# Altium schematic symbol library jlcpcb_2025_04_capacitors_extended_0603.schlib: 3668 symbols (part 9 of 20) (continued)
## CC0603GRNPO9BN201
designator C?  Capacitance: 200pF  (hidden comment: *)
Capacitor, Ceramic (MLCC), 200pF, ±2%, 50V, NP0, ±2%, SMD 0603; Manufacturer: YAGEO; Manufacturer Part Number: CC0603GRNPO9BN201; Package Size: 0603; JLCPCB Basic Part: No; JLCPCB Part Number: C519477; Supplier 1: LCSC; Category: Capacitors - MLCC; Supplier Part Number 1: C519477; Tolerance: ±2%; Voltage Rating: 50V; Temperature Coefficient: NP0; RoHS: Yes; ComponentLink1Description: Datasheet; ComponentLink1URL: https://wmsc.lcsc.com/wmsc/upload/file/pdf/v2/lcsc/2006011835_YAGEO-CC0603GRNPO9BN201_C519477.pdf; ComponentLink2Description: JLCPCB Part URL; ComponentLink2URL: https://jlcpcb.com/partdetail/C519477; ComponentLink3Description: LCSC Part URL; ComponentLink3URL: https://lcsc.com/product-detail/Multilayer-Ceramic-Capacitors-MLCC---SMD-SMT_YAGEO-YAGEO-CC0603GRNPO9BN201_C519477.html
footprint CAP-0603 (0603 (1608M) Capacitor)
pins: 1, 2

## CC0603GRNPO9BN220
designator C?  Capacitance: 22pF  (hidden comment: *)
Capacitor, Ceramic (MLCC), 22pF, ±2%, 50V, NP0, ±2%, SMD 0603; Manufacturer: YAGEO; Manufacturer Part Number: CC0603GRNPO9BN220; Package Size: 0603; JLCPCB Basic Part: No; JLCPCB Part Number: C327276; Supplier 1: LCSC; Category: Capacitors - MLCC; Supplier Part Number 1: C327276; Tolerance: ±2%; Voltage Rating: 50V; Temperature Coefficient: NP0; RoHS: Yes; ComponentLink1Description: Datasheet; ComponentLink1URL: https://wmsc.lcsc.com/wmsc/upload/file/pdf/v2/lcsc/1811141233_YAGEO-CC0603GRNPO9BN220_C327276.pdf; ComponentLink2Description: JLCPCB Part URL; ComponentLink2URL: https://jlcpcb.com/partdetail/C327276; ComponentLink3Description: LCSC Part URL; ComponentLink3URL: https://lcsc.com/product-detail/Multilayer-Ceramic-Capacitors-MLCC---SMD-SMT_YAGEO-YAGEO-CC0603GRNPO9BN220_C327276.html
footprint CAP-0603 (0603 (1608M) Capacitor)
pins: 1, 2

## CC0603GRNPO9BN221
designator C?  Capacitance: 220pF  (hidden comment: *)
Capacitor, Ceramic (MLCC), 220pF, ±2%, 50V, NP0, ±2%, SMD 0603; Manufacturer: YAGEO; Manufacturer Part Number: CC0603GRNPO9BN221; Package Size: 0603; JLCPCB Basic Part: No; JLCPCB Part Number: C327167; Supplier 1: LCSC; Category: Capacitors - MLCC; Supplier Part Number 1: C327167; Tolerance: ±2%; Voltage Rating: 50V; Temperature Coefficient: NP0; RoHS: Yes; ComponentLink1Description: Datasheet; ComponentLink1URL: https://wmsc.lcsc.com/wmsc/upload/file/pdf/v2/lcsc/1811111710_YAGEO-CC0603GRNPO9BN221_C327167.pdf; ComponentLink2Description: JLCPCB Part URL; ComponentLink2URL: https://jlcpcb.com/partdetail/C327167; ComponentLink3Description: LCSC Part URL; ComponentLink3URL: https://lcsc.com/product-detail/Multilayer-Ceramic-Capacitors-MLCC---SMD-SMT_YAGEO-YAGEO-CC0603GRNPO9BN221_C327167.html
footprint CAP-0603 (0603 (1608M) Capacitor)
pins: 1, 2

## CC0603GRNPO9BN222
designator C?  Capacitance: 2.2nF  (hidden comment: *)
Capacitor, Ceramic (MLCC), 2.2nF, ±2%, 50V, NP0, ±2%, SMD 0603; Manufacturer: YAGEO; Manufacturer Part Number: CC0603GRNPO9BN222; Package Size: 0603; JLCPCB Basic Part: No; JLCPCB Part Number: C576798; Supplier 1: LCSC; Category: Capacitors - MLCC; Supplier Part Number 1: C576798; Tolerance: ±2%; Voltage Rating: 50V; Temperature Coefficient: NP0; RoHS: Yes; ComponentLink1Description: Datasheet; ComponentLink1URL: https://wmsc.lcsc.com/wmsc/upload/file/pdf/v2/lcsc/2204291600_YAGEO-CC0603GRNPO9BN222_C576798.pdf; ComponentLink2Description: JLCPCB Part URL; ComponentLink2URL: https://jlcpcb.com/partdetail/C576798; ComponentLink3Description: LCSC Part URL; ComponentLink3URL: https://lcsc.com/product-detail/Multilayer-Ceramic-Capacitors-MLCC---SMD-SMT_YAGEO-YAGEO-CC0603GRNPO9BN222_C576798.html
footprint CAP-0603 (0603 (1608M) Capacitor)
pins: 1, 2

## CC0603GRNPO9BN240
designator C?  Capacitance: 24pF  (hidden comment: *)
Capacitor, Ceramic (MLCC), 24pF, ±2%, 50V, NP0, ±2%, SMD 0603; Manufacturer: YAGEO; Manufacturer Part Number: CC0603GRNPO9BN240; Package Size: 0603; JLCPCB Basic Part: No; JLCPCB Part Number: C519461; Supplier 1: LCSC; Category: Capacitors - MLCC; Supplier Part Number 1: C519461; Tolerance: ±2%; Voltage Rating: 50V; Temperature Coefficient: NP0; RoHS: Yes; ComponentLink1Description: Datasheet; ComponentLink1URL: https://wmsc.lcsc.com/wmsc/upload/file/pdf/v2/lcsc/2005141203_YAGEO-CC0603GRNPO9BN240_C519461.pdf; ComponentLink2Description: JLCPCB Part URL; ComponentLink2URL: https://jlcpcb.com/partdetail/C519461; ComponentLink3Description: LCSC Part URL; ComponentLink3URL: https://lcsc.com/product-detail/Multilayer-Ceramic-Capacitors-MLCC---SMD-SMT_YAGEO-YAGEO-CC0603GRNPO9BN240_C519461.html
footprint CAP-0603 (0603 (1608M) Capacitor)
pins: 1, 2

## CC0603GRNPO9BN270
designator C?  Capacitance: 27pF  (hidden comment: *)
Capacitor, Ceramic (MLCC), 27pF, ±2%, 50V, NP0, ±2%, SMD 0603; Manufacturer: YAGEO; Manufacturer Part Number: CC0603GRNPO9BN270; Package Size: 0603; JLCPCB Basic Part: No; JLCPCB Part Number: C519453; Supplier 1: LCSC; Category: Capacitors - MLCC; Supplier Part Number 1: C519453; Tolerance: ±2%; Voltage Rating: 50V; Temperature Coefficient: NP0; RoHS: Yes; ComponentLink1Description: Datasheet; ComponentLink1URL: https://wmsc.lcsc.com/wmsc/upload/file/pdf/v2/lcsc/2007161234_YAGEO-CC0603GRNPO9BN270_C519453.pdf; ComponentLink2Description: JLCPCB Part URL; ComponentLink2URL: https://jlcpcb.com/partdetail/C519453; ComponentLink3Description: LCSC Part URL; ComponentLink3URL: https://lcsc.com/product-detail/Multilayer-Ceramic-Capacitors-MLCC---SMD-SMT_YAGEO-YAGEO-CC0603GRNPO9BN270_C519453.html
footprint CAP-0603 (0603 (1608M) Capacitor)
pins: 1, 2

## CC0603GRNPO9BN271
designator C?  Capacitance: 270pF  (hidden comment: *)
Capacitor, Ceramic (MLCC), 270pF, ±2%, 50V, NP0, ±2%, SMD 0603; Manufacturer: YAGEO; Manufacturer Part Number: CC0603GRNPO9BN271; Package Size: 0603; JLCPCB Basic Part: No; JLCPCB Part Number: C327196; Supplier 1: LCSC; Category: Capacitors - MLCC; Supplier Part Number 1: C327196; Tolerance: ±2%; Voltage Rating: 50V; Temperature Coefficient: NP0; RoHS: Yes; ComponentLink1Description: Datasheet; ComponentLink1URL: https://wmsc.lcsc.com/wmsc/upload/file/pdf/v2/lcsc/1811141233_YAGEO-CC0603GRNPO9BN271_C327196.pdf; ComponentLink2Description: JLCPCB Part URL; ComponentLink2URL: https://jlcpcb.com/partdetail/C327196; ComponentLink3Description: LCSC Part URL; ComponentLink3URL: https://lcsc.com/product-detail/Multilayer-Ceramic-Capacitors-MLCC---SMD-SMT_YAGEO-YAGEO-CC0603GRNPO9BN271_C327196.html
footprint CAP-0603 (0603 (1608M) Capacitor)
pins: 1, 2

## CC0603GRNPO9BN300
designator C?  Capacitance: 30pF  (hidden comment: *)
Capacitor, Ceramic (MLCC), 30pF, ±2%, 50V, NP0, ±2%, SMD 0603; Manufacturer: YAGEO; Manufacturer Part Number: CC0603GRNPO9BN300; Package Size: 0603; JLCPCB Basic Part: No; JLCPCB Part Number: C327012; Supplier 1: LCSC; Category: Capacitors - MLCC; Supplier Part Number 1: C327012; Tolerance: ±2%; Voltage Rating: 50V; Temperature Coefficient: NP0; RoHS: Yes; ComponentLink1Description: Datasheet; ComponentLink1URL: https://wmsc.lcsc.com/wmsc/upload/file/pdf/v2/lcsc/1811141226_YAGEO-CC0603GRNPO9BN300_C327012.pdf; ComponentLink2Description: JLCPCB Part URL; ComponentLink2URL: https://jlcpcb.com/partdetail/C327012; ComponentLink3Description: LCSC Part URL; ComponentLink3URL: https://lcsc.com/product-detail/Multilayer-Ceramic-Capacitors-MLCC---SMD-SMT_YAGEO-YAGEO-CC0603GRNPO9BN300_C327012.html
footprint CAP-0603 (0603 (1608M) Capacitor)
pins: 1, 2

## CC0603GRNPO9BN301
designator C?  Capacitance: 300pF  (hidden comment: *)
Capacitor, Ceramic (MLCC), 300pF, ±2%, 50V, NP0, ±2%, SMD 0603; Manufacturer: YAGEO; Manufacturer Part Number: CC0603GRNPO9BN301; Package Size: 0603; JLCPCB Basic Part: No; JLCPCB Part Number: C519478; Supplier 1: LCSC; Category: Capacitors - MLCC; Supplier Part Number 1: C519478; Tolerance: ±2%; Voltage Rating: 50V; Temperature Coefficient: NP0; RoHS: Yes; ComponentLink1Description: Datasheet; ComponentLink1URL: https://wmsc.lcsc.com/wmsc/upload/file/pdf/v2/lcsc/2008122133_YAGEO-CC0603GRNPO9BN301_C519478.pdf; ComponentLink2Description: JLCPCB Part URL; ComponentLink2URL: https://jlcpcb.com/partdetail/C519478; ComponentLink3Description: LCSC Part URL; ComponentLink3URL: https://lcsc.com/product-detail/Multilayer-Ceramic-Capacitors-MLCC---SMD-SMT_YAGEO-YAGEO-CC0603GRNPO9BN301_C519478.html
footprint CAP-0603 (0603 (1608M) Capacitor)
pins: 1, 2

## CC0603GRNPO9BN330
designator C?  Capacitance: 33pF  (hidden comment: *)
Capacitor, Ceramic (MLCC), 33pF, ±2%, 50V, NP0, ±2%, SMD 0603; Manufacturer: YAGEO; Manufacturer Part Number: CC0603GRNPO9BN330; Package Size: 0603; JLCPCB Basic Part: No; JLCPCB Part Number: C519454; Supplier 1: LCSC; Category: Capacitors - MLCC; Supplier Part Number 1: C519454; Tolerance: ±2%; Voltage Rating: 50V; Temperature Coefficient: NP0; RoHS: Yes; ComponentLink1Description: Datasheet; ComponentLink1URL: https://wmsc.lcsc.com/wmsc/upload/file/pdf/v2/lcsc/2006011834_YAGEO-CC0603GRNPO9BN330_C519454.pdf; ComponentLink2Description: JLCPCB Part URL; ComponentLink2URL: https://jlcpcb.com/partdetail/C519454; ComponentLink3Description: LCSC Part URL; ComponentLink3URL: https://lcsc.com/product-detail/Multilayer-Ceramic-Capacitors-MLCC---SMD-SMT_YAGEO-YAGEO-CC0603GRNPO9BN330_C519454.html
footprint CAP-0603 (0603 (1608M) Capacitor)
pins: 1, 2

## CC0603GRNPO9BN331
designator C?  Capacitance: 330pF  (hidden comment: *)
Capacitor, Ceramic (MLCC), 330pF, ±2%, 50V, NP0, ±2%, SMD 0603; Manufacturer: YAGEO; Manufacturer Part Number: CC0603GRNPO9BN331; Package Size: 0603; JLCPCB Basic Part: No; JLCPCB Part Number: C327195; Supplier 1: LCSC; Category: Capacitors - MLCC; Supplier Part Number 1: C327195; Tolerance: ±2%; Voltage Rating: 50V; Temperature Coefficient: NP0; RoHS: Yes; ComponentLink1Description: Datasheet; ComponentLink1URL: https://wmsc.lcsc.com/wmsc/upload/file/pdf/v2/lcsc/1811141233_YAGEO-CC0603GRNPO9BN331_C327195.pdf; ComponentLink2Description: JLCPCB Part URL; ComponentLink2URL: https://jlcpcb.com/partdetail/C327195; ComponentLink3Description: LCSC Part URL; ComponentLink3URL: https://lcsc.com/product-detail/Multilayer-Ceramic-Capacitors-MLCC---SMD-SMT_YAGEO-YAGEO-CC0603GRNPO9BN331_C327195.html
footprint CAP-0603 (0603 (1608M) Capacitor)
pins: 1, 2

## CC0603GRNPO9BN360
designator C?  Capacitance: 36pF  (hidden comment: *)
Capacitor, Ceramic (MLCC), 36pF, ±2%, 50V, NP0, ±2%, SMD 0603; Manufacturer: YAGEO; Manufacturer Part Number: CC0603GRNPO9BN360; Package Size: 0603; JLCPCB Basic Part: No; JLCPCB Part Number: C519462; Supplier 1: LCSC; Category: Capacitors - MLCC; Supplier Part Number 1: C519462; Tolerance: ±2%; Voltage Rating: 50V; Temperature Coefficient: NP0; RoHS: Yes; ComponentLink1Description: Datasheet; ComponentLink1URL: https://wmsc.lcsc.com/wmsc/upload/file/pdf/v2/lcsc/2005141203_YAGEO-CC0603GRNPO9BN360_C519462.pdf; ComponentLink2Description: JLCPCB Part URL; ComponentLink2URL: https://jlcpcb.com/partdetail/C519462; ComponentLink3Description: LCSC Part URL; ComponentLink3URL: https://lcsc.com/product-detail/Multilayer-Ceramic-Capacitors-MLCC---SMD-SMT_YAGEO-YAGEO-CC0603GRNPO9BN360_C519462.html
footprint CAP-0603 (0603 (1608M) Capacitor)
pins: 1, 2

## CC0603GRNPO9BN391
designator C?  Capacitance: 390pF  (hidden comment: *)
Capacitor, Ceramic (MLCC), 390pF, ±2%, 50V, NP0, ±2%, SMD 0603; Manufacturer: YAGEO; Manufacturer Part Number: CC0603GRNPO9BN391; Package Size: 0603; JLCPCB Basic Part: No; JLCPCB Part Number: C519471; Supplier 1: LCSC; Category: Capacitors - MLCC; Supplier Part Number 1: C519471; Tolerance: ±2%; Voltage Rating: 50V; Temperature Coefficient: NP0; RoHS: Yes; ComponentLink1Description: Datasheet; ComponentLink1URL: https://wmsc.lcsc.com/wmsc/upload/file/pdf/v2/lcsc/2005181835_YAGEO-CC0603GRNPO9BN391_C519471.pdf; ComponentLink2Description: JLCPCB Part URL; ComponentLink2URL: https://jlcpcb.com/partdetail/C519471; ComponentLink3Description: LCSC Part URL; ComponentLink3URL: https://lcsc.com/product-detail/Multilayer-Ceramic-Capacitors-MLCC---SMD-SMT_YAGEO-YAGEO-CC0603GRNPO9BN391_C519471.html
footprint CAP-0603 (0603 (1608M) Capacitor)
pins: 1, 2

## CC0603GRNPO9BN430
designator C?  Capacitance: 43pF  (hidden comment: *)
Capacitor, Ceramic (MLCC), 43pF, ±2%, 50V, NP0, ±2%, SMD 0603; Manufacturer: YAGEO; Manufacturer Part Number: CC0603GRNPO9BN430; Package Size: 0603; JLCPCB Basic Part: No; JLCPCB Part Number: C519463; Supplier 1: LCSC; Category: Capacitors - MLCC; Supplier Part Number 1: C519463; Tolerance: ±2%; Voltage Rating: 50V; Temperature Coefficient: NP0; RoHS: Yes; ComponentLink1Description: Datasheet; ComponentLink1URL: https://wmsc.lcsc.com/wmsc/upload/file/pdf/v2/lcsc/2007231533_YAGEO-CC0603GRNPO9BN430_C519463.pdf; ComponentLink2Description: JLCPCB Part URL; ComponentLink2URL: https://jlcpcb.com/partdetail/C519463; ComponentLink3Description: LCSC Part URL; ComponentLink3URL: https://lcsc.com/product-detail/Multilayer-Ceramic-Capacitors-MLCC---SMD-SMT_YAGEO-YAGEO-CC0603GRNPO9BN430_C519463.html
footprint CAP-0603 (0603 (1608M) Capacitor)
pins: 1, 2

## CC0603GRNPO9BN470
designator C?  Capacitance: 47pF  (hidden comment: *)
Capacitor, Ceramic (MLCC), 47pF, ±2%, 50V, NP0, ±2%, SMD 0603; Manufacturer: YAGEO; Manufacturer Part Number: CC0603GRNPO9BN470; Package Size: 0603; JLCPCB Basic Part: No; JLCPCB Part Number: C519455; Supplier 1: LCSC; Category: Capacitors - MLCC; Supplier Part Number 1: C519455; Tolerance: ±2%; Voltage Rating: 50V; Temperature Coefficient: NP0; RoHS: Yes; ComponentLink1Description: Datasheet; ComponentLink1URL: https://wmsc.lcsc.com/wmsc/upload/file/pdf/v2/lcsc/2006070931_YAGEO-CC0603GRNPO9BN470_C519455.pdf; ComponentLink2Description: JLCPCB Part URL; ComponentLink2URL: https://jlcpcb.com/partdetail/C519455; ComponentLink3Description: LCSC Part URL; ComponentLink3URL: https://lcsc.com/product-detail/Multilayer-Ceramic-Capacitors-MLCC---SMD-SMT_YAGEO-YAGEO-CC0603GRNPO9BN470_C519455.html
footprint CAP-0603 (0603 (1608M) Capacitor)
pins: 1, 2

## CC0603GRNPO9BN471
designator C?  Capacitance: 470pF  (hidden comment: *)
Capacitor, Ceramic (MLCC), 470pF, ±2%, 50V, NP0, ±2%, SMD 0603; Manufacturer: YAGEO; Manufacturer Part Number: CC0603GRNPO9BN471; Package Size: 0603; JLCPCB Basic Part: No; JLCPCB Part Number: C327194; Supplier 1: LCSC; Category: Capacitors - MLCC; Supplier Part Number 1: C327194; Tolerance: ±2%; Voltage Rating: 50V; Temperature Coefficient: NP0; RoHS: Yes; ComponentLink1Description: Datasheet; ComponentLink1URL: https://wmsc.lcsc.com/wmsc/upload/file/pdf/v2/lcsc/2304140030_YAGEO-CC0603GRNPO9BN471_C327194.pdf; ComponentLink2Description: JLCPCB Part URL; ComponentLink2URL: https://jlcpcb.com/partdetail/C327194; ComponentLink3Description: LCSC Part URL; ComponentLink3URL: https://lcsc.com/product-detail/Multilayer-Ceramic-Capacitors-MLCC---SMD-SMT_YAGEO-YAGEO-CC0603GRNPO9BN471_C327194.html
footprint CAP-0603 (0603 (1608M) Capacitor)
pins: 1, 2

## CC0603GRNPO9BN510
designator C?  Capacitance: 51pF  (hidden comment: *)
Capacitor, Ceramic (MLCC), 51pF, ±2%, 50V, NP0, ±2%, SMD 0603; Manufacturer: YAGEO; Manufacturer Part Number: CC0603GRNPO9BN510; Package Size: 0603; JLCPCB Basic Part: No; JLCPCB Part Number: C519464; Supplier 1: LCSC; Category: Capacitors - MLCC; Supplier Part Number 1: C519464; Tolerance: ±2%; Voltage Rating: 50V; Temperature Coefficient: NP0; RoHS: Yes; ComponentLink1Description: Datasheet; ComponentLink1URL: https://wmsc.lcsc.com/wmsc/upload/file/pdf/v2/lcsc/2005181835_YAGEO-CC0603GRNPO9BN510_C519464.pdf; ComponentLink2Description: JLCPCB Part URL; ComponentLink2URL: https://jlcpcb.com/partdetail/C519464; ComponentLink3Description: LCSC Part URL; ComponentLink3URL: https://lcsc.com/product-detail/Multilayer-Ceramic-Capacitors-MLCC---SMD-SMT_YAGEO-YAGEO-CC0603GRNPO9BN510_C519464.html
footprint CAP-0603 (0603 (1608M) Capacitor)
pins: 1, 2

## CC0603GRNPO9BN560
designator C?  Capacitance: 56pF  (hidden comment: *)
Capacitor, Ceramic (MLCC), 56pF, ±2%, 50V, NP0, ±2%, SMD 0603; Manufacturer: YAGEO; Manufacturer Part Number: CC0603GRNPO9BN560; Package Size: 0603; JLCPCB Basic Part: No; JLCPCB Part Number: C519456; Supplier 1: LCSC; Category: Capacitors - MLCC; Supplier Part Number 1: C519456; Tolerance: ±2%; Voltage Rating: 50V; Temperature Coefficient: NP0; RoHS: Yes; ComponentLink1Description: Datasheet; ComponentLink1URL: https://wmsc.lcsc.com/wmsc/upload/file/pdf/v2/lcsc/2008031233_YAGEO-CC0603GRNPO9BN560_C519456.pdf; ComponentLink2Description: JLCPCB Part URL; ComponentLink2URL: https://jlcpcb.com/partdetail/C519456; ComponentLink3Description: LCSC Part URL; ComponentLink3URL: https://lcsc.com/product-detail/Multilayer-Ceramic-Capacitors-MLCC---SMD-SMT_YAGEO-YAGEO-CC0603GRNPO9BN560_C519456.html
footprint CAP-0603 (0603 (1608M) Capacitor)
pins: 1, 2

## CC0603GRNPO9BN561
designator C?  Capacitance: 560pF  (hidden comment: *)
Capacitor, Ceramic (MLCC), 560pF, ±2%, 50V, NP0, ±2%, SMD 0603; Manufacturer: YAGEO; Manufacturer Part Number: CC0603GRNPO9BN561; Package Size: 0603; JLCPCB Basic Part: No; JLCPCB Part Number: C519472; Supplier 1: LCSC; Category: Capacitors - MLCC; Supplier Part Number 1: C519472; Tolerance: ±2%; Voltage Rating: 50V; Temperature Coefficient: NP0; RoHS: Yes; ComponentLink1Description: Datasheet; ComponentLink1URL: https://wmsc.lcsc.com/wmsc/upload/file/pdf/v2/lcsc/2006011835_YAGEO-CC0603GRNPO9BN561_C519472.pdf; ComponentLink2Description: JLCPCB Part URL; ComponentLink2URL: https://jlcpcb.com/partdetail/C519472; ComponentLink3Description: LCSC Part URL; ComponentLink3URL: https://lcsc.com/product-detail/Multilayer-Ceramic-Capacitors-MLCC---SMD-SMT_YAGEO-YAGEO-CC0603GRNPO9BN561_C519472.html
footprint CAP-0603 (0603 (1608M) Capacitor)
pins: 1, 2

## CC0603GRNPO9BN620
designator C?  Capacitance: 62pF  (hidden comment: *)
Capacitor, Ceramic (MLCC), 62pF, ±2%, 50V, NP0, ±2%, SMD 0603; Manufacturer: YAGEO; Manufacturer Part Number: CC0603GRNPO9BN620; Package Size: 0603; JLCPCB Basic Part: No; JLCPCB Part Number: C519465; Supplier 1: LCSC; Category: Capacitors - MLCC; Supplier Part Number 1: C519465; Tolerance: ±2%; Voltage Rating: 50V; Temperature Coefficient: NP0; RoHS: Yes; ComponentLink1Description: Datasheet; ComponentLink1URL: https://wmsc.lcsc.com/wmsc/upload/file/pdf/v2/lcsc/2006011834_YAGEO-CC0603GRNPO9BN620_C519465.pdf; ComponentLink2Description: JLCPCB Part URL; ComponentLink2URL: https://jlcpcb.com/partdetail/C519465; ComponentLink3Description: LCSC Part URL; ComponentLink3URL: https://lcsc.com/product-detail/Multilayer-Ceramic-Capacitors-MLCC---SMD-SMT_YAGEO-YAGEO-CC0603GRNPO9BN620_C519465.html
footprint CAP-0603 (0603 (1608M) Capacitor)
pins: 1, 2

## CC0603GRNPO9BN621
designator C?  Capacitance: 620pF  (hidden comment: *)
Capacitor, Ceramic (MLCC), 620pF, ±2%, 50V, NP0, ±2%, SMD 0603; Manufacturer: YAGEO; Manufacturer Part Number: CC0603GRNPO9BN621; Package Size: 0603; JLCPCB Basic Part: No; JLCPCB Part Number: C519479; Supplier 1: LCSC; Category: Capacitors - MLCC; Supplier Part Number 1: C519479; Tolerance: ±2%; Voltage Rating: 50V; Temperature Coefficient: NP0; RoHS: Yes; ComponentLink1Description: Datasheet; ComponentLink1URL: https://wmsc.lcsc.com/wmsc/upload/file/pdf/v2/lcsc/2006011835_YAGEO-CC0603GRNPO9BN621_C519479.pdf; ComponentLink2Description: JLCPCB Part URL; ComponentLink2URL: https://jlcpcb.com/partdetail/C519479; ComponentLink3Description: LCSC Part URL; ComponentLink3URL: https://lcsc.com/product-detail/Multilayer-Ceramic-Capacitors-MLCC---SMD-SMT_YAGEO-YAGEO-CC0603GRNPO9BN621_C519479.html
footprint CAP-0603 (0603 (1608M) Capacitor)
pins: 1, 2

## CC0603GRNPO9BN680
designator C?  Capacitance: 68pF  (hidden comment: *)
Capacitor, Ceramic (MLCC), 68pF, ±2%, 50V, NP0, ±2%, SMD 0603; Manufacturer: YAGEO; Manufacturer Part Number: CC0603GRNPO9BN680; Package Size: 0603; JLCPCB Basic Part: No; JLCPCB Part Number: C519457; Supplier 1: LCSC; Category: Capacitors - MLCC; Supplier Part Number 1: C519457; Tolerance: ±2%; Voltage Rating: 50V; Temperature Coefficient: NP0; RoHS: Yes; ComponentLink1Description: Datasheet; ComponentLink1URL: https://wmsc.lcsc.com/wmsc/upload/file/pdf/v2/lcsc/2007231533_YAGEO-CC0603GRNPO9BN680_C519457.pdf; ComponentLink2Description: JLCPCB Part URL; ComponentLink2URL: https://jlcpcb.com/partdetail/C519457; ComponentLink3Description: LCSC Part URL; ComponentLink3URL: https://lcsc.com/product-detail/Multilayer-Ceramic-Capacitors-MLCC---SMD-SMT_YAGEO-YAGEO-CC0603GRNPO9BN680_C519457.html
footprint CAP-0603 (0603 (1608M) Capacitor)
pins: 1, 2

## CC0603GRNPO9BN681
designator C?  Capacitance: 680pF  (hidden comment: *)
Capacitor, Ceramic (MLCC), 680pF, ±2%, 50V, NP0, ±2%, SMD 0603; Manufacturer: YAGEO; Manufacturer Part Number: CC0603GRNPO9BN681; Package Size: 0603; JLCPCB Basic Part: No; JLCPCB Part Number: C519473; Supplier 1: LCSC; Category: Capacitors - MLCC; Supplier Part Number 1: C519473; Tolerance: ±2%; Voltage Rating: 50V; Temperature Coefficient: NP0; RoHS: Yes; ComponentLink1Description: Datasheet; ComponentLink1URL: https://wmsc.lcsc.com/wmsc/upload/file/pdf/v2/lcsc/2006011835_YAGEO-CC0603GRNPO9BN681_C519473.pdf; ComponentLink2Description: JLCPCB Part URL; ComponentLink2URL: https://jlcpcb.com/partdetail/C519473; ComponentLink3Description: LCSC Part URL; ComponentLink3URL: https://lcsc.com/product-detail/Multilayer-Ceramic-Capacitors-MLCC---SMD-SMT_YAGEO-YAGEO-CC0603GRNPO9BN681_C519473.html
footprint CAP-0603 (0603 (1608M) Capacitor)
pins: 1, 2

## CC0603GRNPO9BN750
designator C?  Capacitance: 75pF  (hidden comment: *)
Capacitor, Ceramic (MLCC), 75pF, ±2%, 50V, NP0, ±2%, SMD 0603; Manufacturer: YAGEO; Manufacturer Part Number: CC0603GRNPO9BN750; Package Size: 0603; JLCPCB Basic Part: No; JLCPCB Part Number: C519466; Supplier 1: LCSC; Category: Capacitors - MLCC; Supplier Part Number 1: C519466; Tolerance: ±2%; Voltage Rating: 50V; Temperature Coefficient: NP0; RoHS: Yes; ComponentLink1Description: Datasheet; ComponentLink1URL: https://wmsc.lcsc.com/wmsc/upload/file/pdf/v2/lcsc/2005181835_YAGEO-CC0603GRNPO9BN750_C519466.pdf; ComponentLink2Description: JLCPCB Part URL; ComponentLink2URL: https://jlcpcb.com/partdetail/C519466; ComponentLink3Description: LCSC Part URL; ComponentLink3URL: https://lcsc.com/product-detail/Multilayer-Ceramic-Capacitors-MLCC---SMD-SMT_YAGEO-YAGEO-CC0603GRNPO9BN750_C519466.html
footprint CAP-0603 (0603 (1608M) Capacitor)
pins: 1, 2

## CC0603GRNPO9BN820
designator C?  Capacitance: 82pF  (hidden comment: *)
Capacitor, Ceramic (MLCC), 82pF, ±2%, 50V, NP0, ±2%, SMD 0603; Manufacturer: YAGEO; Manufacturer Part Number: CC0603GRNPO9BN820; Package Size: 0603; JLCPCB Basic Part: No; JLCPCB Part Number: C519458; Supplier 1: LCSC; Category: Capacitors - MLCC; Supplier Part Number 1: C519458; Tolerance: ±2%; Voltage Rating: 50V; Temperature Coefficient: NP0; RoHS: Yes; ComponentLink1Description: Datasheet; ComponentLink1URL: https://wmsc.lcsc.com/wmsc/upload/file/pdf/v2/lcsc/2007161234_YAGEO-CC0603GRNPO9BN820_C519458.pdf; ComponentLink2Description: JLCPCB Part URL; ComponentLink2URL: https://jlcpcb.com/partdetail/C519458; ComponentLink3Description: LCSC Part URL; ComponentLink3URL: https://lcsc.com/product-detail/Multilayer-Ceramic-Capacitors-MLCC---SMD-SMT_YAGEO-YAGEO-CC0603GRNPO9BN820_C519458.html
footprint CAP-0603 (0603 (1608M) Capacitor)
pins: 1, 2

## CC0603GRNPO9BN821
designator C?  Capacitance: 820pF  (hidden comment: *)
Capacitor, Ceramic (MLCC), 820pF, ±2%, 50V, NP0, ±2%, SMD 0603; Manufacturer: YAGEO; Manufacturer Part Number: CC0603GRNPO9BN821; Package Size: 0603; JLCPCB Basic Part: No; JLCPCB Part Number: C519474; Supplier 1: LCSC; Category: Capacitors - MLCC; Supplier Part Number 1: C519474; Tolerance: ±2%; Voltage Rating: 50V; Temperature Coefficient: NP0; RoHS: Yes; ComponentLink1Description: Datasheet; ComponentLink1URL: https://wmsc.lcsc.com/wmsc/upload/file/pdf/v2/lcsc/2006011835_YAGEO-CC0603GRNPO9BN821_C519474.pdf; ComponentLink2Description: JLCPCB Part URL; ComponentLink2URL: https://jlcpcb.com/partdetail/C519474; ComponentLink3Description: LCSC Part URL; ComponentLink3URL: https://lcsc.com/product-detail/Multilayer-Ceramic-Capacitors-MLCC---SMD-SMT_YAGEO-YAGEO-CC0603GRNPO9BN821_C519474.html
footprint CAP-0603 (0603 (1608M) Capacitor)
pins: 1, 2

## CC0603GRNPO9BN910
designator C?  Capacitance: 91pF  (hidden comment: *)
Capacitor, Ceramic (MLCC), 91pF, ±2%, 50V, NP0, ±2%, SMD 0603; Manufacturer: YAGEO; Manufacturer Part Number: CC0603GRNPO9BN910; Package Size: 0603; JLCPCB Basic Part: No; JLCPCB Part Number: C519467; Supplier 1: LCSC; Category: Capacitors - MLCC; Supplier Part Number 1: C519467; Tolerance: ±2%; Voltage Rating: 50V; Temperature Coefficient: NP0; RoHS: Yes; ComponentLink1Description: Datasheet; ComponentLink1URL: https://wmsc.lcsc.com/wmsc/upload/file/pdf/v2/lcsc/2006011834_YAGEO-CC0603GRNPO9BN910_C519467.pdf; ComponentLink2Description: JLCPCB Part URL; ComponentLink2URL: https://jlcpcb.com/partdetail/C519467; ComponentLink3Description: LCSC Part URL; ComponentLink3URL: https://lcsc.com/product-detail/Multilayer-Ceramic-Capacitors-MLCC---SMD-SMT_YAGEO-YAGEO-CC0603GRNPO9BN910_C519467.html
footprint CAP-0603 (0603 (1608M) Capacitor)
pins: 1, 2

## CC0603JRNPO0BN100
designator C?  Capacitance: 10pF  (hidden comment: *)
Capacitor, Ceramic (MLCC), 10pF, ±5%, 100V, NP0, ±5%, SMD 0603; Manufacturer: YAGEO; Manufacturer Part Number: CC0603JRNPO0BN100; Package Size: 0603; JLCPCB Basic Part: No; JLCPCB Part Number: C576799; Supplier 1: LCSC; Category: Capacitors - MLCC; Supplier Part Number 1: C576799; Tolerance: ±5%; Voltage Rating: 100V; Temperature Coefficient: NP0; RoHS: Yes; ComponentLink1Description: Datasheet; ComponentLink1URL: https://wmsc.lcsc.com/wmsc/upload/file/pdf/v2/lcsc/2008171233_YAGEO-CC0603JRNPO0BN100_C576799.pdf; ComponentLink2Description: JLCPCB Part URL; ComponentLink2URL: https://jlcpcb.com/partdetail/C576799; ComponentLink3Description: LCSC Part URL; ComponentLink3URL: https://lcsc.com/product-detail/Multilayer-Ceramic-Capacitors-MLCC---SMD-SMT_YAGEO-YAGEO-CC0603JRNPO0BN100_C576799.html
footprint CAP-0603 (0603 (1608M) Capacitor)
pins: 1, 2

## CC0603JRNPO0BN101
designator C?  Capacitance: 100pF  (hidden comment: *)
Capacitor, Ceramic (MLCC), 100pF, ±5%, 100V, NP0, ±5%, SMD 0603; Manufacturer: YAGEO; Manufacturer Part Number: CC0603JRNPO0BN101; Package Size: 0603; JLCPCB Basic Part: No; JLCPCB Part Number: C107033; Supplier 1: LCSC; Category: Capacitors - MLCC; Supplier Part Number 1: C107033; Tolerance: ±5%; Voltage Rating: 100V; Temperature Coefficient: NP0; RoHS: Yes; ComponentLink1Description: Datasheet; ComponentLink1URL: https://wmsc.lcsc.com/wmsc/upload/file/pdf/v2/lcsc/2304140030_YAGEO-CC0603JRNPO0BN101_C107033.pdf; ComponentLink2Description: JLCPCB Part URL; ComponentLink2URL: https://jlcpcb.com/partdetail/C107033; ComponentLink3Description: LCSC Part URL; ComponentLink3URL: https://lcsc.com/product-detail/Multilayer-Ceramic-Capacitors-MLCC---SMD-SMT_YAGEO-YAGEO-CC0603JRNPO0BN101_C107033.html
footprint CAP-0603 (0603 (1608M) Capacitor)
pins: 1, 2

## CC0603JRNPO0BN102
designator C?  Capacitance: 1nF  (hidden comment: *)
Capacitor, Ceramic (MLCC), 1nF, ±5%, 100V, NP0, ±5%, SMD 0603; Manufacturer: YAGEO; Manufacturer Part Number: CC0603JRNPO0BN102; Package Size: 0603; JLCPCB Basic Part: No; JLCPCB Part Number: C113793; Supplier 1: LCSC; Category: Capacitors - MLCC; Supplier Part Number 1: C113793; Tolerance: ±5%; Voltage Rating: 100V; Temperature Coefficient: NP0; RoHS: Yes; ComponentLink1Description: Datasheet; ComponentLink1URL: https://wmsc.lcsc.com/wmsc/upload/file/pdf/v2/lcsc/2008121132_YAGEO-CC0603JRNPO0BN102_C113793.pdf; ComponentLink2Description: JLCPCB Part URL; ComponentLink2URL: https://jlcpcb.com/partdetail/C113793; ComponentLink3Description: LCSC Part URL; ComponentLink3URL: https://lcsc.com/product-detail/Multilayer-Ceramic-Capacitors-MLCC---SMD-SMT_YAGEO-YAGEO-CC0603JRNPO0BN102_C113793.html
footprint CAP-0603 (0603 (1608M) Capacitor)
pins: 1, 2

## CC0603JRNPO0BN120
designator C?  Capacitance: 12pF  (hidden comment: *)
Capacitor, Ceramic (MLCC), 12pF, ±5%, 100V, NP0, ±5%, SMD 0603; Manufacturer: YAGEO; Manufacturer Part Number: CC0603JRNPO0BN120; Package Size: 0603; JLCPCB Basic Part: No; JLCPCB Part Number: C576801; Supplier 1: LCSC; Category: Capacitors - MLCC; Supplier Part Number 1: C576801; Tolerance: ±5%; Voltage Rating: 100V; Temperature Coefficient: NP0; RoHS: Yes; ComponentLink1Description: Datasheet; ComponentLink1URL: https://wmsc.lcsc.com/wmsc/upload/file/pdf/v2/lcsc/2204021130_YAGEO-CC0603JRNPO0BN120_C576801.pdf; ComponentLink2Description: JLCPCB Part URL; ComponentLink2URL: https://jlcpcb.com/partdetail/C576801; ComponentLink3Description: LCSC Part URL; ComponentLink3URL: https://lcsc.com/product-detail/Multilayer-Ceramic-Capacitors-MLCC---SMD-SMT_YAGEO-YAGEO-CC0603JRNPO0BN120_C576801.html
footprint CAP-0603 (0603 (1608M) Capacitor)
pins: 1, 2

## CC0603JRNPO0BN121
designator C?  Capacitance: 120pF  (hidden comment: *)
Capacitor, Ceramic (MLCC), 120pF, ±5%, 100V, NP0, ±5%, SMD 0603; Manufacturer: YAGEO; Manufacturer Part Number: CC0603JRNPO0BN121; Package Size: 0603; JLCPCB Basic Part: No; JLCPCB Part Number: C327221; Supplier 1: LCSC; Category: Capacitors - MLCC; Supplier Part Number 1: C327221; Tolerance: ±5%; Voltage Rating: 100V; Temperature Coefficient: NP0; RoHS: Yes; ComponentLink1Description: Datasheet; ComponentLink1URL: https://wmsc.lcsc.com/wmsc/upload/file/pdf/v2/lcsc/1811141233_YAGEO-CC0603JRNPO0BN121_C327221.pdf; ComponentLink2Description: JLCPCB Part URL; ComponentLink2URL: https://jlcpcb.com/partdetail/C327221; ComponentLink3Description: LCSC Part URL; ComponentLink3URL: https://lcsc.com/product-detail/Multilayer-Ceramic-Capacitors-MLCC---SMD-SMT_YAGEO-YAGEO-CC0603JRNPO0BN121_C327221.html
footprint CAP-0603 (0603 (1608M) Capacitor)
pins: 1, 2

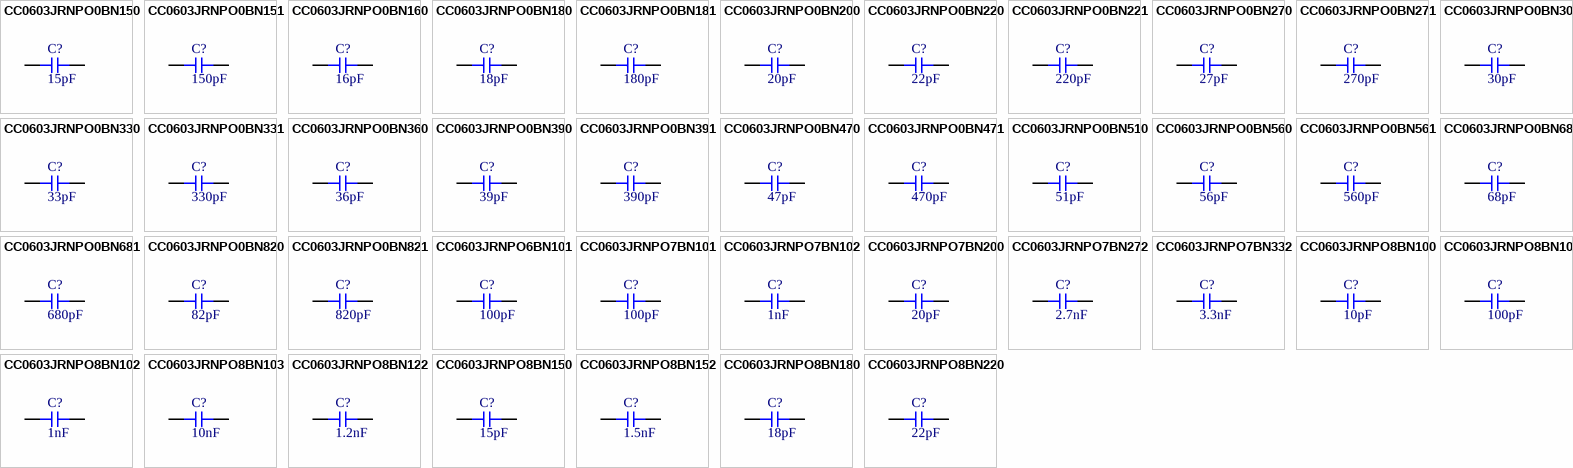
[diagram p39: symbols CC0603JRNPO0BN150 to CC0603JRNPO8BN220]

## CC0603JRNPO0BN150
designator C?  Capacitance: 15pF  (hidden comment: *)
Capacitor, Ceramic (MLCC), 15pF, ±5%, 100V, NP0, ±5%, SMD 0603; Manufacturer: YAGEO; Manufacturer Part Number: CC0603JRNPO0BN150; Package Size: 0603; JLCPCB Basic Part: No; JLCPCB Part Number: C327117; Supplier 1: LCSC; Category: Capacitors - MLCC; Supplier Part Number 1: C327117; Tolerance: ±5%; Voltage Rating: 100V; Temperature Coefficient: NP0; RoHS: Yes; ComponentLink1Description: Datasheet; ComponentLink1URL: https://wmsc.lcsc.com/wmsc/upload/file/pdf/v2/lcsc/2311211121_YAGEO-CC0603JRNPO0BN150_C327117.pdf; ComponentLink2Description: JLCPCB Part URL; ComponentLink2URL: https://jlcpcb.com/partdetail/C327117; ComponentLink3Description: LCSC Part URL; ComponentLink3URL: https://lcsc.com/product-detail/Multilayer-Ceramic-Capacitors-MLCC---SMD-SMT_YAGEO-YAGEO-CC0603JRNPO0BN150_C327117.html
footprint CAP-0603 (0603 (1608M) Capacitor)
pins: 1, 2

## CC0603JRNPO0BN151
designator C?  Capacitance: 150pF  (hidden comment: *)
Capacitor, Ceramic (MLCC), 150pF, ±5%, 100V, NP0, ±5%, SMD 0603; Manufacturer: YAGEO; Manufacturer Part Number: CC0603JRNPO0BN151; Package Size: 0603; JLCPCB Basic Part: No; JLCPCB Part Number: C576803; Supplier 1: LCSC; Category: Capacitors - MLCC; Supplier Part Number 1: C576803; Tolerance: ±5%; Voltage Rating: 100V; Temperature Coefficient: NP0; RoHS: Yes; ComponentLink1Description: Datasheet; ComponentLink1URL: https://wmsc.lcsc.com/wmsc/upload/file/pdf/v2/lcsc/2008061233_YAGEO-CC0603JRNPO0BN151_C576803.pdf; ComponentLink2Description: JLCPCB Part URL; ComponentLink2URL: https://jlcpcb.com/partdetail/C576803; ComponentLink3Description: LCSC Part URL; ComponentLink3URL: https://lcsc.com/product-detail/Multilayer-Ceramic-Capacitors-MLCC---SMD-SMT_YAGEO-YAGEO-CC0603JRNPO0BN151_C576803.html
footprint CAP-0603 (0603 (1608M) Capacitor)
pins: 1, 2

## CC0603JRNPO0BN160
designator C?  Capacitance: 16pF  (hidden comment: *)
Capacitor, Ceramic (MLCC), 16pF, ±5%, 100V, NP0, ±5%, SMD 0603; Manufacturer: YAGEO; Manufacturer Part Number: CC0603JRNPO0BN160; Package Size: 0603; JLCPCB Basic Part: No; JLCPCB Part Number: C527060; Supplier 1: LCSC; Category: Capacitors - MLCC; Supplier Part Number 1: C527060; Tolerance: ±5%; Voltage Rating: 100V; Temperature Coefficient: NP0; RoHS: Yes; ComponentLink1Description: Datasheet; ComponentLink1URL: https://wmsc.lcsc.com/wmsc/upload/file/pdf/v2/lcsc/2006101834_YAGEO-CC0603JRNPO0BN160_C527060.pdf; ComponentLink2Description: JLCPCB Part URL; ComponentLink2URL: https://jlcpcb.com/partdetail/C527060; ComponentLink3Description: LCSC Part URL; ComponentLink3URL: https://lcsc.com/product-detail/Multilayer-Ceramic-Capacitors-MLCC---SMD-SMT_YAGEO-YAGEO-CC0603JRNPO0BN160_C527060.html
footprint CAP-0603 (0603 (1608M) Capacitor)
pins: 1, 2

## CC0603JRNPO0BN180
designator C?  Capacitance: 18pF  (hidden comment: *)
Capacitor, Ceramic (MLCC), 18pF, ±5%, 100V, NP0, ±5%, SMD 0603; Manufacturer: YAGEO; Manufacturer Part Number: CC0603JRNPO0BN180; Package Size: 0603; JLCPCB Basic Part: No; JLCPCB Part Number: C576804; Supplier 1: LCSC; Category: Capacitors - MLCC; Supplier Part Number 1: C576804; Tolerance: ±5%; Voltage Rating: 100V; Temperature Coefficient: NP0; RoHS: Yes; ComponentLink1Description: Datasheet; ComponentLink1URL: https://wmsc.lcsc.com/wmsc/upload/file/pdf/v2/lcsc/2304140030_YAGEO-CC0603JRNPO0BN180_C576804.pdf; ComponentLink2Description: JLCPCB Part URL; ComponentLink2URL: https://jlcpcb.com/partdetail/C576804; ComponentLink3Description: LCSC Part URL; ComponentLink3URL: https://lcsc.com/product-detail/Multilayer-Ceramic-Capacitors-MLCC---SMD-SMT_YAGEO-YAGEO-CC0603JRNPO0BN180_C576804.html
footprint CAP-0603 (0603 (1608M) Capacitor)
pins: 1, 2

## CC0603JRNPO0BN181
designator C?  Capacitance: 180pF  (hidden comment: *)
Capacitor, Ceramic (MLCC), 180pF, ±5%, 100V, NP0, ±5%, SMD 0603; Manufacturer: YAGEO; Manufacturer Part Number: CC0603JRNPO0BN181; Package Size: 0603; JLCPCB Basic Part: No; JLCPCB Part Number: C113794; Supplier 1: LCSC; Category: Capacitors - MLCC; Supplier Part Number 1: C113794; Tolerance: ±5%; Voltage Rating: 100V; Temperature Coefficient: NP0; RoHS: Yes; ComponentLink1Description: Datasheet; ComponentLink1URL: https://wmsc.lcsc.com/wmsc/upload/file/pdf/v2/lcsc/2304140030_YAGEO-CC0603JRNPO0BN181_C113794.pdf; ComponentLink2Description: JLCPCB Part URL; ComponentLink2URL: https://jlcpcb.com/partdetail/C113794; ComponentLink3Description: LCSC Part URL; ComponentLink3URL: https://lcsc.com/product-detail/Multilayer-Ceramic-Capacitors-MLCC---SMD-SMT_YAGEO-YAGEO-CC0603JRNPO0BN181_C113794.html
footprint CAP-0603 (0603 (1608M) Capacitor)
pins: 1, 2

## CC0603JRNPO0BN200
designator C?  Capacitance: 20pF  (hidden comment: *)
Capacitor, Ceramic (MLCC), 20pF, ±5%, 100V, NP0, ±5%, SMD 0603; Manufacturer: YAGEO; Manufacturer Part Number: CC0603JRNPO0BN200; Package Size: 0603; JLCPCB Basic Part: No; JLCPCB Part Number: C527061; Supplier 1: LCSC; Category: Capacitors - MLCC; Supplier Part Number 1: C527061; Tolerance: ±5%; Voltage Rating: 100V; Temperature Coefficient: NP0; RoHS: Yes; ComponentLink1Description: Datasheet; ComponentLink1URL: https://wmsc.lcsc.com/wmsc/upload/file/pdf/v2/lcsc/2006031835_YAGEO-CC0603JRNPO0BN200_C527061.pdf; ComponentLink2Description: JLCPCB Part URL; ComponentLink2URL: https://jlcpcb.com/partdetail/C527061; ComponentLink3Description: LCSC Part URL; ComponentLink3URL: https://lcsc.com/product-detail/Multilayer-Ceramic-Capacitors-MLCC---SMD-SMT_YAGEO-YAGEO-CC0603JRNPO0BN200_C527061.html
footprint CAP-0603 (0603 (1608M) Capacitor)
pins: 1, 2

## CC0603JRNPO0BN220
designator C?  Capacitance: 22pF  (hidden comment: *)
Capacitor, Ceramic (MLCC), 22pF, ±5%, 100V, NP0, ±5%, SMD 0603; Manufacturer: YAGEO; Manufacturer Part Number: CC0603JRNPO0BN220; Package Size: 0603; JLCPCB Basic Part: No; JLCPCB Part Number: C513605; Supplier 1: LCSC; Category: Capacitors - MLCC; Supplier Part Number 1: C513605; Tolerance: ±5%; Voltage Rating: 100V; Temperature Coefficient: NP0; RoHS: Yes; ComponentLink1Description: Datasheet; ComponentLink1URL: https://wmsc.lcsc.com/wmsc/upload/file/pdf/v2/lcsc/2005142148_YAGEO-CC0603JRNPO0BN220_C513605.pdf; ComponentLink2Description: JLCPCB Part URL; ComponentLink2URL: https://jlcpcb.com/partdetail/C513605; ComponentLink3Description: LCSC Part URL; ComponentLink3URL: https://lcsc.com/product-detail/Multilayer-Ceramic-Capacitors-MLCC---SMD-SMT_YAGEO-YAGEO-CC0603JRNPO0BN220_C513605.html
footprint CAP-0603 (0603 (1608M) Capacitor)
pins: 1, 2

## CC0603JRNPO0BN221
designator C?  Capacitance: 220pF  (hidden comment: *)
Capacitor, Ceramic (MLCC), 220pF, ±5%, 100V, NP0, ±5%, SMD 0603; Manufacturer: YAGEO; Manufacturer Part Number: CC0603JRNPO0BN221; Package Size: 0603; JLCPCB Basic Part: No; JLCPCB Part Number: C327164; Supplier 1: LCSC; Category: Capacitors - MLCC; Supplier Part Number 1: C327164; Tolerance: ±5%; Voltage Rating: 100V; Temperature Coefficient: NP0; RoHS: Yes; ComponentLink1Description: Datasheet; ComponentLink1URL: https://wmsc.lcsc.com/wmsc/upload/file/pdf/v2/lcsc/1811141233_YAGEO-CC0603JRNPO0BN221_C327164.pdf; ComponentLink2Description: JLCPCB Part URL; ComponentLink2URL: https://jlcpcb.com/partdetail/C327164; ComponentLink3Description: LCSC Part URL; ComponentLink3URL: https://lcsc.com/product-detail/Multilayer-Ceramic-Capacitors-MLCC---SMD-SMT_YAGEO-YAGEO-CC0603JRNPO0BN221_C327164.html
footprint CAP-0603 (0603 (1608M) Capacitor)
pins: 1, 2

## CC0603JRNPO0BN270
designator C?  Capacitance: 27pF  (hidden comment: *)
Capacitor, Ceramic (MLCC), 27pF, ±5%, 100V, NP0, ±5%, SMD 0603; Manufacturer: YAGEO; Manufacturer Part Number: CC0603JRNPO0BN270; Package Size: 0603; JLCPCB Basic Part: No; JLCPCB Part Number: C576805; Supplier 1: LCSC; Category: Capacitors - MLCC; Supplier Part Number 1: C576805; Tolerance: ±5%; Voltage Rating: 100V; Temperature Coefficient: NP0; RoHS: Yes; ComponentLink1Description: Datasheet; ComponentLink1URL: https://wmsc.lcsc.com/wmsc/upload/file/pdf/v2/lcsc/2311211121_YAGEO-CC0603JRNPO0BN270_C576805.pdf; ComponentLink2Description: JLCPCB Part URL; ComponentLink2URL: https://jlcpcb.com/partdetail/C576805; ComponentLink3Description: LCSC Part URL; ComponentLink3URL: https://lcsc.com/product-detail/Multilayer-Ceramic-Capacitors-MLCC---SMD-SMT_YAGEO-YAGEO-CC0603JRNPO0BN270_C576805.html
footprint CAP-0603 (0603 (1608M) Capacitor)
pins: 1, 2

## CC0603JRNPO0BN271
designator C?  Capacitance: 270pF  (hidden comment: *)
Capacitor, Ceramic (MLCC), 270pF, ±5%, 100V, NP0, ±5%, SMD 0603; Manufacturer: YAGEO; Manufacturer Part Number: CC0603JRNPO0BN271; Package Size: 0603; JLCPCB Basic Part: No; JLCPCB Part Number: C327124; Supplier 1: LCSC; Category: Capacitors - MLCC; Supplier Part Number 1: C327124; Tolerance: ±5%; Voltage Rating: 100V; Temperature Coefficient: NP0; RoHS: Yes; ComponentLink1Description: Datasheet; ComponentLink1URL: https://wmsc.lcsc.com/wmsc/upload/file/pdf/v2/lcsc/2311211121_YAGEO-CC0603JRNPO0BN271_C327124.pdf; ComponentLink2Description: JLCPCB Part URL; ComponentLink2URL: https://jlcpcb.com/partdetail/C327124; ComponentLink3Description: LCSC Part URL; ComponentLink3URL: https://lcsc.com/product-detail/Multilayer-Ceramic-Capacitors-MLCC---SMD-SMT_YAGEO-YAGEO-CC0603JRNPO0BN271_C327124.html
footprint CAP-0603 (0603 (1608M) Capacitor)
pins: 1, 2

## CC0603JRNPO0BN300
designator C?  Capacitance: 30pF  (hidden comment: *)
Capacitor, Ceramic (MLCC), 30pF, ±5%, 100V, NP0, ±5%, SMD 0603; Manufacturer: YAGEO; Manufacturer Part Number: CC0603JRNPO0BN300; Package Size: 0603; JLCPCB Basic Part: No; JLCPCB Part Number: C576806; Supplier 1: LCSC; Category: Capacitors - MLCC; Supplier Part Number 1: C576806; Tolerance: ±5%; Voltage Rating: 100V; Temperature Coefficient: NP0; RoHS: Yes; ComponentLink1Description: Datasheet; ComponentLink1URL: https://wmsc.lcsc.com/wmsc/upload/file/pdf/v2/lcsc/2211161830_YAGEO-CC0603JRNPO0BN300_C576806.pdf; ComponentLink2Description: JLCPCB Part URL; ComponentLink2URL: https://jlcpcb.com/partdetail/C576806; ComponentLink3Description: LCSC Part URL; ComponentLink3URL: https://lcsc.com/product-detail/Multilayer-Ceramic-Capacitors-MLCC---SMD-SMT_YAGEO-YAGEO-CC0603JRNPO0BN300_C576806.html
footprint CAP-0603 (0603 (1608M) Capacitor)
pins: 1, 2

## CC0603JRNPO0BN330
designator C?  Capacitance: 33pF  (hidden comment: *)
Capacitor, Ceramic (MLCC), 33pF, ±5%, 100V, NP0, ±5%, SMD 0603; Manufacturer: YAGEO; Manufacturer Part Number: CC0603JRNPO0BN330; Package Size: 0603; JLCPCB Basic Part: No; JLCPCB Part Number: C576807; Supplier 1: LCSC; Category: Capacitors - MLCC; Supplier Part Number 1: C576807; Tolerance: ±5%; Voltage Rating: 100V; Temperature Coefficient: NP0; RoHS: Yes; ComponentLink1Description: Datasheet; ComponentLink1URL: https://wmsc.lcsc.com/wmsc/upload/file/pdf/v2/lcsc/2202251630_YAGEO-CC0603JRNPO0BN330_C576807.pdf; ComponentLink2Description: JLCPCB Part URL; ComponentLink2URL: https://jlcpcb.com/partdetail/C576807; ComponentLink3Description: LCSC Part URL; ComponentLink3URL: https://lcsc.com/product-detail/Multilayer-Ceramic-Capacitors-MLCC---SMD-SMT_YAGEO-YAGEO-CC0603JRNPO0BN330_C576807.html
footprint CAP-0603 (0603 (1608M) Capacitor)
pins: 1, 2

## CC0603JRNPO0BN331
designator C?  Capacitance: 330pF  (hidden comment: *)
Capacitor, Ceramic (MLCC), 330pF, ±5%, 100V, NP0, ±5%, SMD 0603; Manufacturer: YAGEO; Manufacturer Part Number: CC0603JRNPO0BN331; Package Size: 0603; JLCPCB Basic Part: No; JLCPCB Part Number: C327088; Supplier 1: LCSC; Category: Capacitors - MLCC; Supplier Part Number 1: C327088; Tolerance: ±5%; Voltage Rating: 100V; Temperature Coefficient: NP0; RoHS: Yes; ComponentLink1Description: Datasheet; ComponentLink1URL: https://wmsc.lcsc.com/wmsc/upload/file/pdf/v2/lcsc/1811141226_YAGEO-CC0603JRNPO0BN331_C327088.pdf; ComponentLink2Description: JLCPCB Part URL; ComponentLink2URL: https://jlcpcb.com/partdetail/C327088; ComponentLink3Description: LCSC Part URL; ComponentLink3URL: https://lcsc.com/product-detail/Multilayer-Ceramic-Capacitors-MLCC---SMD-SMT_YAGEO-YAGEO-CC0603JRNPO0BN331_C327088.html
footprint CAP-0603 (0603 (1608M) Capacitor)
pins: 1, 2

## CC0603JRNPO0BN360
designator C?  Capacitance: 36pF  (hidden comment: *)
Capacitor, Ceramic (MLCC), 36pF, ±5%, 100V, NP0, ±5%, SMD 0603; Manufacturer: YAGEO; Manufacturer Part Number: CC0603JRNPO0BN360; Package Size: 0603; JLCPCB Basic Part: No; JLCPCB Part Number: C527062; Supplier 1: LCSC; Category: Capacitors - MLCC; Supplier Part Number 1: C527062; Tolerance: ±5%; Voltage Rating: 100V; Temperature Coefficient: NP0; RoHS: Yes; ComponentLink1Description: Datasheet; ComponentLink1URL: https://wmsc.lcsc.com/wmsc/upload/file/pdf/v2/lcsc/2007021836_YAGEO-CC0603JRNPO0BN360_C527062.pdf; ComponentLink2Description: JLCPCB Part URL; ComponentLink2URL: https://jlcpcb.com/partdetail/C527062; ComponentLink3Description: LCSC Part URL; ComponentLink3URL: https://lcsc.com/product-detail/Multilayer-Ceramic-Capacitors-MLCC---SMD-SMT_YAGEO-YAGEO-CC0603JRNPO0BN360_C527062.html
footprint CAP-0603 (0603 (1608M) Capacitor)
pins: 1, 2

## CC0603JRNPO0BN390
designator C?  Capacitance: 39pF  (hidden comment: *)
Capacitor, Ceramic (MLCC), 39pF, ±5%, 100V, NP0, ±5%, SMD 0603; Manufacturer: YAGEO; Manufacturer Part Number: CC0603JRNPO0BN390; Package Size: 0603; JLCPCB Basic Part: No; JLCPCB Part Number: C527063; Supplier 1: LCSC; Category: Capacitors - MLCC; Supplier Part Number 1: C527063; Tolerance: ±5%; Voltage Rating: 100V; Temperature Coefficient: NP0; RoHS: Yes; ComponentLink1Description: Datasheet; ComponentLink1URL: https://wmsc.lcsc.com/wmsc/upload/file/pdf/v2/lcsc/2005222139_YAGEO-CC0603JRNPO0BN390_C527063.pdf; ComponentLink2Description: JLCPCB Part URL; ComponentLink2URL: https://jlcpcb.com/partdetail/C527063; ComponentLink3Description: LCSC Part URL; ComponentLink3URL: https://lcsc.com/product-detail/Multilayer-Ceramic-Capacitors-MLCC---SMD-SMT_YAGEO-YAGEO-CC0603JRNPO0BN390_C527063.html
footprint CAP-0603 (0603 (1608M) Capacitor)
pins: 1, 2
